# Altium footprint library GRID.PcbLib: 59 footprints (part 4 of 4)
Each footprint in its own frame and in the unit in brackets; x right, y up, seen from the top. Pads: shape width x height; smd on the part's side, far side on the other; paste and mask are expansions set on the pad; w line width, h text height; cw(c..) or ccw(c..) is an arc to the next point about the centre after c.
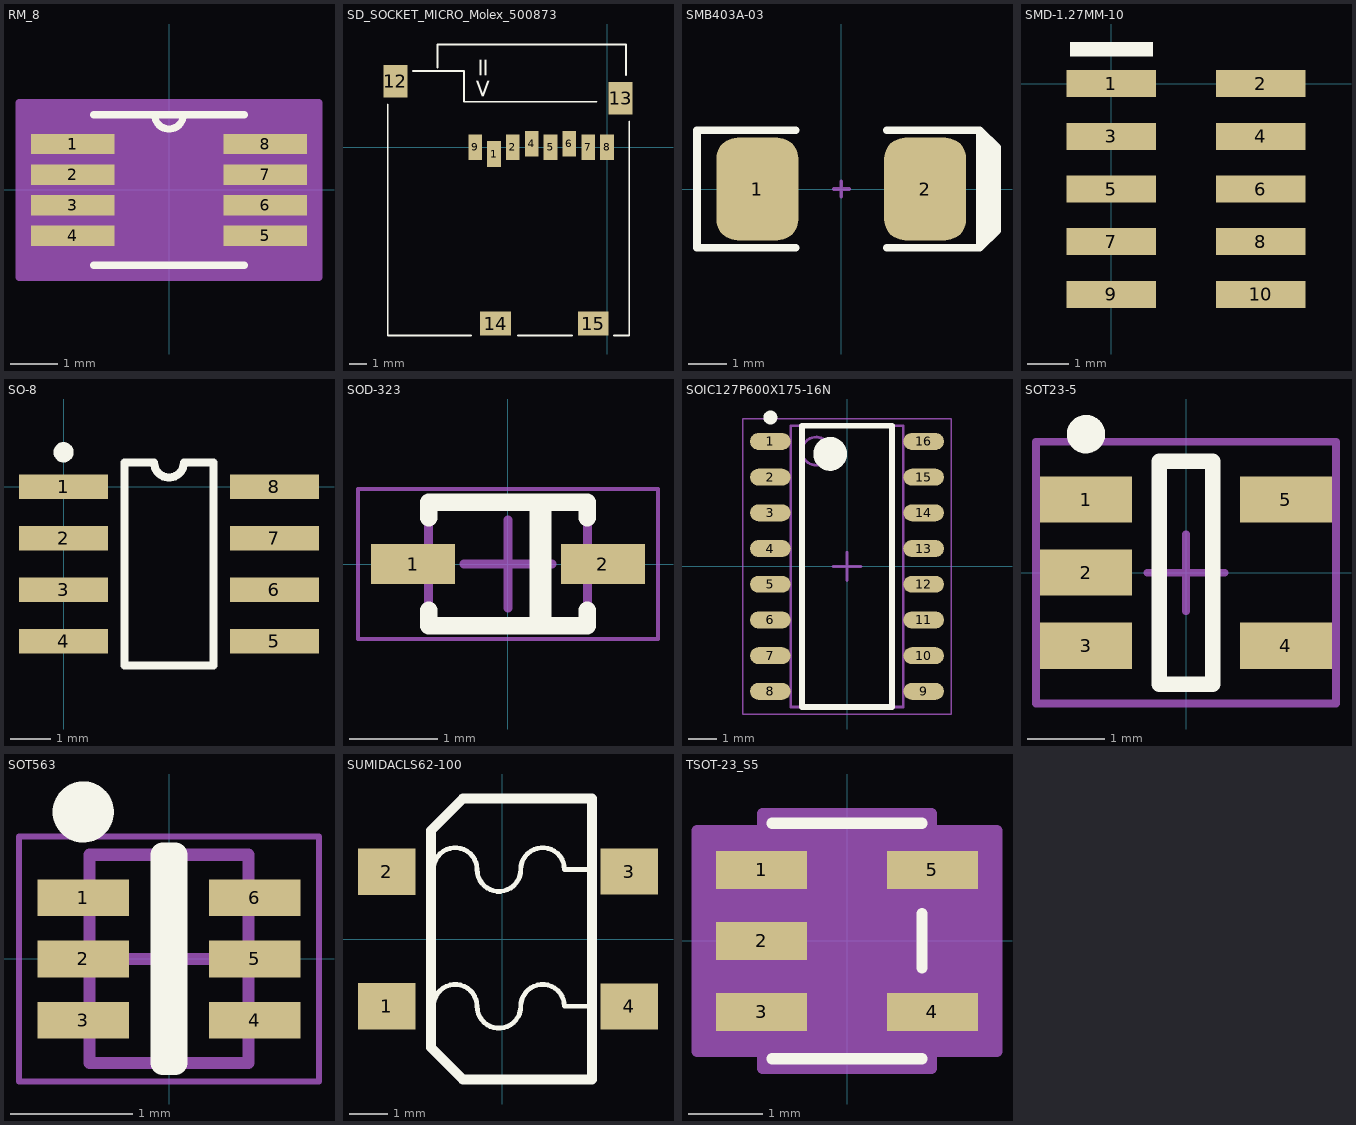
[diagram p3: the footprints below, top view; thin cyan lines are the x and y axes]

## RM_8 [mil]
pads (8):
  rect 70x17 smd mask+4: 1(-80.5,38.39) 2(-80.5,12.8) 3(-80.5,-12.8) 4(-80.5,-38.39) 5(80.5,-38.39) 6(80.5,-12.8) 7(80.5,12.8) 8(80.5,38.39)
Top Overlay:
  lines w6: -63,-63 63,-63 ; -63,63 63,63 ; -12,63 ccw(c0,63) 12,63
Mechanical 13:
  lines w0: -12,63 ccw(c0,63) 12,63
Mechanical 15:
  region: 125.5,-73 -125.5,-73 -125.5,73 125.5,73
  lines w6: -125.5,-73 125.5,-73 125.5,73 -125.5,73 -125.5,-73
3D body "RM_8.stp": height 43.1, standoff 0, extent -101.5,-63 101.5,63

## SD_SOCKET_MICRO_Molex_500873 [mm] "Molex Micro SD card socket with"
height 2.54
pads (12):
  rect 0.8x1.5 smd: 1(-6.6,-0.4) 2(-5.5,0) 4(-4.4,0.2) 5(-3.3,0) 6(-2.2,0.2) 7(-1.1,0) 8(0,0) 9(-7.7,0)
  rect 1.4x1.9 smd: 12(-12.36,3.85) 13(0.79,2.85)
  rect 1.8x1.4 smd: 14(-6.51,-10.3) 15(-0.81,-10.3)
Top Overlay:
  lines w0.102: -12.8,2.5 -12.8,-11 -7.95,-11 ; -11.35,4.45 -8.358,4.45 -8.358,2.646 -0.6,2.646 ; -9.9,4.65 -9.9,6 1.1,6 1.1,4.2 ; -5.2,-11 -2.05,-11 ; 0.4,-11 1.3,-11 1.3,1.5
  text "=>" at -7.7,5.25 h1.07
3D body "SW3dPS-Micro_SD.STEP": height 1.95, standoff 0.97, extent -9.9,-9.05 1.1,5.95
3D body "5008730816.stp": height 2, standoff 0.1, extent -12.8,-10.851 1.2,4.35

## SMB403A-03 [mm] "DO-214-AA/SMB; 2 C-Bend Leads; Body 5.3 x 3.6 mm, inc. leads (LxW)"
height 2.54
pads (2):
  rrect50% 2.159x2.7 smd: 1(-2.21,0) 2(2.21,0)
Top Overlay:
  lines w0.2: -1.2,-1.55 -3.8,-1.55 -3.8,1.55 -1.2,1.55 ; 1.2,-1.55 3.65,-1.55 ; 1.2,1.55 3.65,1.55 ; 3.828,1.365 3.828,-1.346 3.962,-1.212 3.962,1.238 ; 3.65,-1.55 4.1,-1.1 4.1,1.1 3.65,1.55 ; 3.65,-1.55 3.65,1.55
Mechanical 1:
  lines w0.1: -0.2,0 0.2,0 ; 0,-0.2 0,0.2

## SMD-1.27MM-10 [mm]
height 2.54
pads (10):
  rect 2.15x0.65 smd: 1(0,0) 2(3.6,0) 3(0,-1.27) 4(3.6,-1.27) 5(0,-2.54) 6(3.6,-2.54) 7(0,-3.81) 8(3.6,-3.81) 9(0,-5.08) 10(3.6,-5.08)
Top Overlay:
  rectangle: -1,0.65 1,1
3D body "User Library-PLLD1_27-xx-SPLLD1_27-10-S.STEP": height 3.9, standoff 0, extent -0.7,-5.65 4.3,0.7

## SO-8 [mm]
height 5.72
pads (8):
  rect 2.2x0.6 smd: 1(0,0) 2(0,-1.27) 3(0,-2.54) 4(0,-3.81) 5(5.2,-3.81) 6(5.2,-2.54) 7(5.2,-1.27) 8(5.2,0)
Top Overlay:
  circle w0.25: c0,0.85 r0.125
  lines w0.2: 1.5,-4.405 1.5,0.595 2.233,0.595 ccw(c2.6,0.595) 2.967,0.595 3.7,0.595 3.7,-4.405 1.5,-4.405
3D body "SW3dPS-so-8.STEP": height 1.88, standoff -0.03, extent -0.629,-4.419 5.709,0.584

## SOD-323 [mm] "SODFL, 2-Leads, Body 1.25x2.50mm, IPC Medium Density"
height 0.8
pads (2):
  rect 0.95x0.45 smd: 1(-1.075,0) 2(1.075,0)
Top Overlay:
  lines w0.127: 0.309,-0.7 0.309,0.7 ; 0.432,-0.701 0.432,0.699
  lines w0.2: -0.9,-0.525 -0.9,-0.7 0.9,-0.7 0.9,-0.525 ; -0.9,0.525 -0.9,0.7 0.9,0.7 0.9,0.525
Mechanical 13:
  lines w0.1: -0.9,-0.675 -0.9,0.675 0.9,0.675 0.9,-0.675 -0.9,-0.675
Mechanical 15:
  lines w0.05: -1.7,-0.85 -1.7,0.85 1.7,0.85 1.7,-0.85 -1.7,-0.85
  lines w0.1: -0.5,0 0.5,0 ; 0,-0.5 0,0.5
3D body: height 0.8, standoff 0, extent -0.9,-0.675 0.9,0.675

## SOIC127P600X175-16N [mm] "SOIC, 16-Leads, Body 9.90x3.90mm, Pitch 1.27mm, IPC Medium Density"
height 1.75
pads (16):
  oval 1.45x0.6 smd: 1(-2.725,4.445) 2(-2.725,3.175) 3(-2.725,1.905) 4(-2.725,0.635) 5(-2.725,-0.635) 6(-2.725,-1.905) 7(-2.725,-3.175) 8(-2.725,-4.445) 9(2.725,-4.445) 10(2.725,-3.175) 11(2.725,-1.905) 12(2.725,-0.635) 13(2.725,0.635) 14(2.725,1.905) 15(2.725,3.175) 16(2.725,4.445)
Top Overlay:
  circle w0.25: c-2.725,5.295 r0.125
  circle w0.6: c-0.6,4 r0.3
  lines w0.2: -1.6,-5 -1.6,5 1.6,5 1.6,-5 -1.6,-5
Mechanical 13:
  circle w0.1: c-1.1,4.1 r0.5
  lines w0.1: -2,-5 -2,5 2,5 2,-5 -2,-5
Mechanical 15:
  lines w0.05: -3.7,-5.25 -3.7,5.25 3.7,5.25 3.7,-5.25 -3.7,-5.25
  lines w0.1: -0.5,0 0.5,0 ; 0,-0.5 0,0.5
3D body "SOIC127P600X175-16N.step": height 1.75, standoff 0, extent -3,-5 3,5

## SOT23-5 [mm] "SOT23, for LT1964, 5-Leads, Body 2.9x2.8mm (max), Pitch 0.95mm, IPC Medium Density"
height 1
pads (5):
  rect 1.2x0.6 smd: 1(-1.3,0.95) 2(-1.3,0) 3(-1.3,-0.95) 4(1.3,-0.95) 5(1.3,0.95)
Top Overlay:
  circle w0.25: c-1.3,1.8 r0.125
  lines w0.2: -0.35,-1.45 0.35,-1.45 0.35,1.45 -0.35,1.45 -0.35,-1.45
Mechanical 15:
  lines w0.1: -0.5,0 0.5,0 ; 0,-0.5 0,0.5 ; -1.95,-1.7 -1.95,1.7 1.95,1.7 1.95,-1.7 -1.95,-1.7
3D body "User Library-sot235.STEP": height 1, standoff 0, extent -1.37,-1.46 0.97,1.46

## SOT563 [mm] "SOTFL, 6-Leads, Body 1.60x1.60mm, Pitch 0.50mm, IPC Medium Density"
height 0.6
pads (6):
  rect 0.75x0.3 smd: 1(-0.7,0.5) 2(-0.7,0) 3(-0.7,-0.5) 4(0.7,-0.5) 5(0.7,0) 6(0.7,0.5)
Top Overlay:
  circle w0.25: c-0.7,1.2 r0.125
  lines w0.2: -0.05,-0.85 0.05,-0.85 0.05,0.85 -0.05,0.85 -0.05,-0.85
Mechanical 13:
  lines w0.1: -0.65,-0.85 -0.65,0.85 0.65,0.85 0.65,-0.85 -0.65,-0.85
Mechanical 15:
  lines w0.05: -1.225,-1 -1.225,1 1.225,1 1.225,-1 -1.225,-1
  lines w0.1: -0.5,0 0.5,0 ; 0,-0.5 0,0.5
3D body: height 0.6, standoff 0, extent -0.65,-0.85 0.65,0.85

## SUMIDACLS62-100 [mm]
pads (4):
  rect 1.5x1.2 smd: 1(-3,-1.75) 2(-3,1.75) 3(3.3,1.753) 4(3.3,-1.753)
Top Overlay:
  lines w0.127: -1.79,-1.75 cw(c-1.222,-1.75) -0.654,-1.75 ccw(c-0.086,-1.75) 0.482,-1.75 cw(c1.05,-1.75) 1.618,-1.75 2.334,-1.75 ; -1.79,1.806 cw(c-1.222,1.806) -0.654,1.806 ccw(c-0.086,1.806) 0.482,1.806 cw(c1.05,1.806) 1.618,1.806 2.334,1.806
  lines w0.254: -1.854,-2.819 -1.854,2.819 -1.024,3.65 2.337,3.65 2.337,-3.65 -1.024,-3.65 -1.854,-2.819

## TSOT-23_S5 [mil]
pads (5):
  rect 48x20 smd mask+0: 1(-45,37.4) 2(-45,0) 3(-45,-37.4) 4(45,-37.4) 5(45,37.4)
Top Overlay:
  lines w6: -39.5,-62 39.5,-62 ; -39.5,62 39.5,62 ; 39.5,-14.3 39.5,14.3
Mechanical 13:
  lines w0: -12,57 ccw(c0,57) 12,57
Mechanical 15:
  region: -44.5,-58.1 -79,-58.1 -79,58.1 -44.5,58.1 -44.5,67 44.5,67 44.5,58.1 79,58.1 79,-58.1 44.5,-58.1 44.5,-67 -44.5,-67
  lines w6: -79,-58.1 -79,58.1 -44.5,58.1 -44.5,67 44.5,67 44.5,58.1 79,58.1 79,-58.1 44.5,-58.1 44.5,-67 -44.5,-67 -44.5,-58.1 -79,-58.1